# Altium footprint library GamePI PCB LIB.PcbLib: 24 footprints (part 1 of 2)
Each footprint in its own frame and in the unit in brackets; x right, y up, seen from the top. Pads: shape width x height; smd on the part's side, far side on the other; paste and mask are expansions set on the pad; w line width, h text height; cw(c..) or ccw(c..) is an arc to the next point about the centre after c.
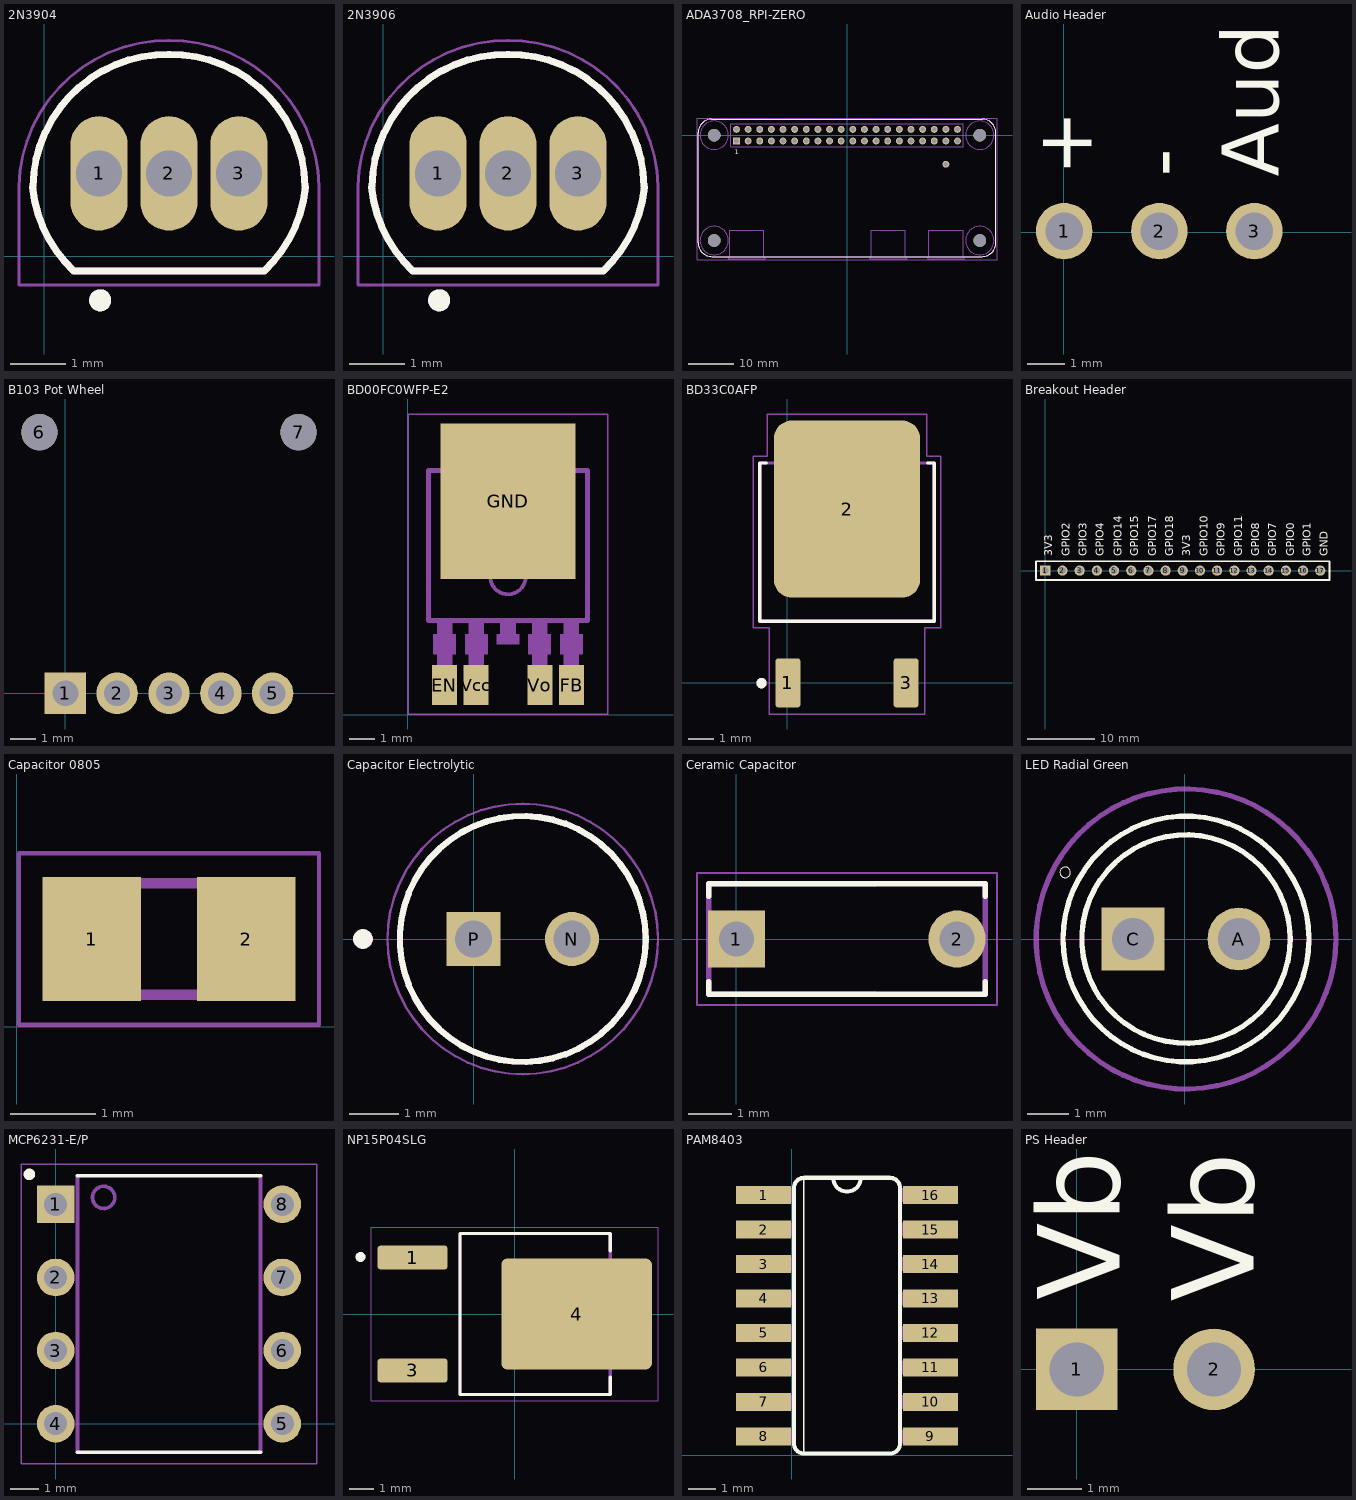
[diagram p0: the footprints below, top view; thin cyan lines are the x and y axes]

## 2N3904 [mm]
pads (3):
  oval 1.04x2.08 hole 0.84: 1(1,1.5) 2(2.27,1.5) 3(3.54,1.5)
Top Overlay:
  circle w0.2: c1.02,-0.805 r0.1
  lines w0.127: -0.206,1.258 ccw(c2.154,1.464) 0.538,-0.269 ; -0.205,1.26 cw(c2.242,1.218) 2.285,3.665 ; 0.545,-0.275 3.995,-0.275 ; 2.255,3.665 cw(c2.298,1.218) 4.745,1.26 ; 4.002,-0.269 ccw(c2.386,1.464) 4.746,1.258
Mechanical 13:
  circle w0.2: c1.02,-0.805 r0.1
  lines w0.127: -0.206,1.258 ccw(c2.154,1.464) 0.538,-0.269 ; -0.205,1.26 cw(c2.242,1.218) 2.285,3.665 ; 0.545,-0.275 3.995,-0.275 ; 2.255,3.665 cw(c2.298,1.218) 4.745,1.26 ; 4.002,-0.269 ccw(c2.386,1.464) 4.746,1.258
Mechanical 15:
  lines w0.05: -0.455,1.245 -0.455,-0.525 4.995,-0.525 4.995,1.245 ; -0.455,1.265 cw(c2.242,1.218) 2.29,3.915 ; 2.25,3.915 cw(c2.298,1.218) 4.995,1.265
3D body "step_temp.STEP": height 5.2, standoff -15.24, extent -0.006,-0.048 4.553,3.785

## 2N3906 [mm]
pads (3):
  oval 1.04x2.08 hole 0.84: 1(1,1.5) 2(2.27,1.5) 3(3.54,1.5)
Top Overlay:
  circle w0.2: c1.02,-0.805 r0.1
  lines w0.127: -0.206,1.258 ccw(c2.154,1.464) 0.538,-0.269 ; -0.205,1.26 cw(c2.242,1.218) 2.285,3.665 ; 0.545,-0.275 3.995,-0.275 ; 2.255,3.665 cw(c2.298,1.218) 4.745,1.26 ; 4.002,-0.269 ccw(c2.386,1.464) 4.746,1.258
Mechanical 13:
  circle w0.2: c1.02,-0.805 r0.1
  lines w0.127: -0.206,1.258 ccw(c2.154,1.464) 0.538,-0.269 ; -0.205,1.26 cw(c2.242,1.218) 2.285,3.665 ; 0.545,-0.275 3.995,-0.275 ; 2.255,3.665 cw(c2.298,1.218) 4.745,1.26 ; 4.002,-0.269 ccw(c2.386,1.464) 4.746,1.258
Mechanical 15:
  lines w0.05: -0.455,1.245 -0.455,-0.525 4.995,-0.525 4.995,1.245 ; -0.455,1.265 cw(c2.242,1.218) 2.29,3.915 ; 2.25,3.915 cw(c2.298,1.218) 4.995,1.265
3D body "step_temp.STEP": height 5.2, standoff -15.24, extent -0.006,-0.048 4.553,3.785

## ADA3708_RPI-ZERO [mm]
pads (45):
  rect 1.508x1.508 hole 1: 1(-24.13,-1.27)
  round 1.508 hole 1: 2(-24.13,1.27) 3(-21.59,-1.27) 4(-21.59,1.27) 5(-19.05,-1.27) 6(-19.05,1.27) 7(-16.51,-1.27) 8(-16.51,1.27) 9(-13.97,-1.27) 10(-13.97,1.27) 11(-11.43,-1.27) 12(-11.43,1.27) 13(-8.89,-1.27) 14(-8.89,1.27) 15(-6.35,-1.27) 16(-6.35,1.27) 17(-3.81,-1.27) 18(-3.81,1.27) 19(-1.27,-1.27) 20(-1.27,1.27) 21(1.27,-1.27) 22(1.27,1.27) 23(3.81,-1.27) 24(3.81,1.27) 25(6.35,-1.27) 26(6.35,1.27) 27(8.89,-1.27) 28(8.89,1.27) 29(11.43,-1.27) 30(11.43,1.27) 31(13.97,-1.27) 32(13.97,1.27) 33(16.51,-1.27) 34(16.51,1.27) 35(19.05,-1.27) 36(19.05,1.27) 37(21.59,-1.27) 38(21.59,1.27) 39(24.13,-1.27) 40(24.13,1.27) 41(21.59,-6.35)
  round 2.75 hole 2.75 unplated: ""(-29,-23) ""(-29,0) ""(29,-23) ""(29,0)
Top Overlay:
  lines w0.127: 4.4,-26.5 12.75,-26.5 ; 17,-26.5 25.35,-26.5 ; -32.5,-23.5 ccw(c-29.5,-23.5) -29.5,-26.5 29.5,-26.5 ccw(c29.5,-23.5) 32.5,-23.5 32.5,0.5 ccw(c29.5,0.5) 29.5,3.5 -29.5,3.5 ccw(c-29.5,0.5) -32.5,0.5 -32.5,-23.5
  text "1" at -24.473,-4.132 h1.02
Mechanical 13:
  circle w0.127: c-29,0 r3.1
  circle w0.127: c29,0 r3.1
  circle w0.127: c29,-23 r3.1
  circle w0.127: c-29,-23 r3.1
  lines w0.127: 4.4,-26.5 5.25,-26.5 ; 17,-26.5 17.85,-26.5 ; -25.65,-26.5 -25.9,-27 -17.9,-27 -18.15,-26.5 ; -25.65,-26.5 -25.65,-20.75 -18.15,-20.75 -18.15,-26.5 ; -25.65,-26.5 -18.15,-26.5 ; -25.65,-26.5 -29.5,-26.5 cw(c-29.5,-23.5) -32.5,-23.5 -32.5,0.5 cw(c-29.5,0.5) -29.5,3.5 29.5,3.5 cw(c29.5,0.5) 32.5,0.5 32.5,-23.5 cw(c29.5,-23.5) 29.5,-26.5 -18.15,-26.5 ; 5.25,-26.5 5,-27 13,-27 12.75,-26.5 ; 5.25,-26.5 5.25,-20.75 12.75,-20.75 12.75,-26.5 ; 5.25,-26.5 12.75,-26.5 ; 17.85,-26.5 17.6,-27 25.6,-27 25.35,-26.5 ; 17.85,-26.5 17.85,-20.75 25.35,-20.75 25.35,-26.5 ; 17.85,-26.5 25.35,-26.5 ; -25.4,-2.54 25.4,-2.54 25.4,2.54 -25.4,2.54 -25.4,-2.54
Mechanical 15:
  lines w0.05: -32.75,-27.25 -32.75,3.75 32.75,3.75 32.75,-27.25 -32.75,-27.25
3D body "ADA3708--3DModel-STEP-56544.STEP": height -0.37, standoff -11.29, extent -32.5,-27.43 33.5,3.57

## Audio Header [mm]
pads (3):
  round 1.508 hole 1: 1(0.01,0.025) 2(2.55,0.025) 3(5.09,0.025)
Top Overlay:
  text "Audio" at 5.746,1.479 h1.52
  text "-" at 3.308,1.479 h1.52
  text "+" at 0.75,1.504 h1.52

## B103 Pot Wheel [mm]
pads (7):
  rect 1.6x1.6 hole 1: 1(0,0)
  round 1.6 hole 1: 2(2,0) 3(4,0) 4(6,0) 5(8,0)
  round 1.4 hole 1.4 unplated: 6(-1,10.075) 7(9,10.075)
3D body "potentiometre disk 5pin.step": height 3.5, standoff -2.38, extent -4,-0.45 12,15.55

## BD00FC0WFP-E2 [mm]
pads (5):
  rect 1x1.6 smd: EN(1.46,1.178) FB(6.54,1.178) Vcc(2.73,1.178) Vo(5.27,1.178)
  rect 5.4x6.2 smd: GND(4,8.508)
Mechanical 13:
  circle w0.152: c4,5.508 r0.707
  region: 4.3,2.808 3.7,2.808 3.7,3.808 4.3,3.808
  region: 1.77,0.958 1.17,0.958 1.17,3.808 1.77,3.808
  region: 3.04,0.958 2.44,0.958 2.44,3.808 3.04,3.808
  region: 5.56,0.958 4.96,0.958 4.96,3.808 5.56,3.808
  region: 6.83,0.958 6.23,0.958 6.23,3.808 6.83,3.808
  region: 1.92,2.408 1.02,2.408 1.02,3.208 1.92,3.208
  region: 3.19,2.408 2.29,2.408 2.29,3.208 3.19,3.208
  region: 5.71,2.408 4.81,2.408 4.81,3.208 5.71,3.208
  region: 6.98,2.408 6.08,2.408 6.08,3.208 6.98,3.208
  region: 4.45,2.808 3.55,2.808 3.55,3.208 4.45,3.208
  region: 6.565,9.895 1.435,9.895 1.435,10.764 1.968,10.764 1.968,10.58 6.032,10.58 6.032,10.764 6.565,10.764
  lines w0.203: 0.823,3.748 0.823,9.743 7.177,9.743 7.177,3.749 0.822,3.749
Mechanical 15:
  lines w0.051: 0.027,0.025 7.973,0.025 7.973,11.991 0.027,11.991 0.027,0.025
3D body "to252-4_p1-27_l6-8_w5-8.stp": height 2.4, standoff -0.01, extent 0.6,0.5 7.4,10.7

## BD33C0AFP [mm]
pads (3):
  rrect24% 0.96x1.9 smd: 1(0.02,-0.01) 3(4.58,-0.01)
  rrect24% 5.63x6.84 smd paste-4: 2(2.3,6.7)
Top Overlay:
  circle w0.2: c-1,-0.02 r0.1
  lines w0.127: -0.822,8.475 -1.07,8.475 -1.07,2.375 5.67,2.375 5.67,8.475 5.422,8.475
Top Paste:
  region: 4.08,4.537 0.517,4.537 0.517,8.863 4.08,8.863
Mechanical 13:
  circle w0.2: c-1,-0.02 r0.1
  lines w0.127: -1.07,2.375 5.67,2.375 5.67,8.475 -1.07,8.475 -1.07,2.375
Mechanical 15:
  lines w0.05: -1.32,2.12 -1.32,8.73 -0.77,8.73 -0.77,10.37 5.37,10.37 5.37,8.73 5.92,8.73 5.92,2.12 5.31,2.12 5.31,-1.21 -0.71,-1.21 -0.71,2.12 -1.32,2.12
3D body "BD33C0AFP-CE2.STEP": height 2.5, standoff 0, extent -0.95,-0.12 5.55,9.38

## Breakout Header [mm]
pads (17):
  rect 1.508x1.508 hole 1: 1(0,0)
  round 1.508 hole 1: 2(2.54,0) 3(5.08,0) 4(7.62,0) 5(10.16,0) 6(12.7,0) 7(15.24,0) 8(17.78,0) 9(20.32,0) 10(22.86,0) 11(25.4,0) 12(27.94,0) 13(30.48,0) 14(33.02,0) 15(35.56,0) 16(38.1,0) 17(40.64,0)
Top Overlay:
  lines w0.254: -1.375,-1.375 42,-1.375 42,1.375 -1.375,1.375 -1.375,-1.375
  text "GND" at 41.771,2.129 h1.2
  text "GPIO1" at 39.271,2.129 h1.2
  text "GPIO0" at 36.771,2.129 h1.2
  text "GPIO7" at 34.146,2.129 h1.2
  text "GPIO8" at 31.646,2.129 h1.2
  text "GPIO11" at 29.146,2.129 h1.2
  text "GPIO9" at 26.521,2.129 h1.2
  text "GPIO10" at 24.021,2.129 h1.2
  text "3V3" at 21.396,2.129 h1.2
  text "GPIO18" at 18.896,2.129 h1.2
  text "GPIO17" at 16.396,2.129 h1.2
  text "GPIO15" at 13.771,2.129 h1.2
  text "GPIO14" at 11.271,2.129 h1.2
  text "GPIO4" at 8.646,2.129 h1.2
  text "GPIO3" at 6.146,2.129 h1.2
  text "GPIO2" at 3.646,2.129 h1.2
  text "3V3" at 1.021,2.129 h1.2

## Capacitor 0805 [mm]
pads (2):
  rect 1.15x1.45 smd: 1(0.875,1.025) 2(2.675,1.025)
Mechanical 13:
  lines w0.127: 0.775,0.375 2.775,0.375 2.775,1.675 0.775,1.675 0.775,0.375
Mechanical 15:
  lines w0.05: 0.025,0.025 3.525,0.025 3.525,2.025 0.025,2.025 0.025,0.025
3D body "step_temp.STEP": height 0.94, standoff 0, extent 0.77,0.4 2.78,1.65

## Capacitor Electrolytic [mm]
pads (2):
  round 1.1 hole 0.75: N(2,0)
  rect 1.1x1.1 hole 0.75: P(0,0)
Top Overlay:
  circle w0.127: c1,0 r2.5
  circle w0.2: c-2.25,0 r0.1
Mechanical 13:
  circle w0.127: c1,0 r2.5
  circle w0.2: c-2.25,0 r0.1
Mechanical 15:
  circle w0.05: c1,0 r2.75
3D body "step_temp.STEP": height 11, standoff -17, extent -1.5,-2.498 3.5,2.498

## Ceramic Capacitor [mm]
pads (2):
  rect 1.318x1.318 / inner round 1.318 / far side rect 1.318x1.318 hole 0.81: 1(0,0)
  round 1.318 hole 0.81: 2(5.08,0)
Top Overlay:
  lines w0.127: -0.635,-0.979 -0.635,-1.27 5.725,-1.27 5.725,-0.979 ; -0.635,0.979 -0.635,1.27 5.725,1.27 5.725,0.979
Mechanical 13:
  lines w0.127: 3.175,-1.27 -0.635,-1.27 -0.635,1.27 3.175,1.27 ; 5.725,-1.27 5.725,-0.635 5.725,0.635 5.725,1.27
Mechanical 15:
  lines w0.05: -0.909,-1.52 -0.909,1.52 6,1.52 6,-1.52 -0.909,-1.52

## LED Radial Green [mm]
pads (2):
  round 1.508 hole 1: A(1.3,0)
  rect 1.508x1.508 hole 1: C(-1.24,0)
Top Overlay:
  circle w0.127: c0.03,0 r2.95
  circle w0.127: c0.03,0 r2.5
  circle w0: c-2.87,1.6 r0.127
Mechanical 15:
  circle w0.127: c0.03,0 r3.6
3D body "WP7113GD.STEP": height 9.6, standoff -26, extent -2.5,-2.95 2.934,2.95

## MCP6231-E/P [mm]
pads (8):
  rect 1.308x1.308 hole 0.8: 1(0,7.62)
  round 1.308 hole 0.8: 2(0,5.08) 3(0,2.54) 4(0,0) 5(7.87,0) 6(7.87,2.54) 7(7.87,5.08) 8(7.87,7.62)
Top Overlay:
  circle w0.2: c-0.915,8.66 r0.1
  lines w0.127: 0.755,-0.99 7.115,-0.99 ; 0.755,8.61 7.115,8.61
Mechanical 13:
  circle w0.127: c1.665,7.86 r0.386
  lines w0.127: 0.755,-0.99 0.755,8.61 ; 7.115,-0.99 7.115,8.61
Mechanical 15:
  lines w0.05: -1.195,-1.4 -1.195,9.02 9.065,9.02 9.065,-1.4 -1.195,-1.4
3D body "MCP6231-E_P.STEP": height 5.52, standoff -3.62, extent -0.037,-0.835 7.837,8.436

## NP15P04SLG [mm]
pads (3):
  rrect25% 2.83x0.97 smd mask+0: 1(-4.14,2.29) 3(-4.14,-2.29)
  rrect10% 6.1x4.49 smd paste-4 mask+0: 4(2.51,0)
Top Overlay:
  circle w0.2: c-6.25,2.312 r0.1
  lines w0.127: 3.872,-2.565 3.872,-3.27 -2.222,-3.27 -2.222,3.27 3.872,3.27 3.872,2.565
Mechanical 13:
  circle w0.2: c-6.25,2.312 r0.1
  lines w0.127: -2.222,-3.27 -2.222,3.27 3.872,3.27 3.872,-3.27 -2.222,-3.27
Mechanical 15:
  lines w0.05: -5.805,-3.52 -5.805,3.52 5.81,3.52 5.81,-3.52 -5.805,-3.52
3D body "step_temp.STEP": height 2.39, standoff -0.13, extent -4.952,-3.27 4.952,3.27

## PAM8403 [mil]
pads (16):
  rect 80x26 smd: 1(-41.12,377.56) 2(-41.12,327.56) 3(-41.12,277.56) 4(-41.12,227.56) 5(-41.12,177.56) 6(-41.12,127.56) 7(-41.12,77.56) 8(-41.12,27.56) 9(200.88,27.56) 10(200.88,77.56) 11(200.88,127.56) 12(200.88,177.56) 13(200.88,227.56) 14(200.88,277.56) 15(200.88,327.56) 16(200.88,377.56)
Top Overlay:
  lines w2: 16.88,2.56 16.88,402.56
  lines w6: 59.88,402.56 ccw(c79.88,402.56) 99.88,402.56 ; 2.88,17.56 ccw(c17.88,17.56) 17.88,2.56 141.88,2.56 ccw(c141.88,17.56) 156.88,17.56 156.88,387.56 ccw(c141.88,387.56) 141.88,402.56 17.88,402.56 ccw(c17.88,387.56) 2.88,387.56 2.88,17.56
Mechanical 13:
  region: 201.88,217.56 156.88,217.56 156.88,237.56 201.88,237.56
  region: 2.88,367.56 -42.12,367.56 -42.12,387.56 2.88,387.56
  region: 2.88,317.56 -42.12,317.56 -42.12,337.56 2.88,337.56
  region: 3.88,267.56 -41.12,267.56 -41.12,287.56 3.88,287.56
  region: 2.88,217.56 -42.12,217.56 -42.12,237.56 2.88,237.56
  region: 201.88,267.56 156.88,267.56 156.88,287.56 201.88,287.56
  region: 201.88,317.56 156.88,317.56 156.88,337.56 201.88,337.56
  region: 201.88,367.56 156.88,367.56 156.88,387.56 201.88,387.56
  region: 2.88,167.56 -42.12,167.56 -42.12,187.56 2.88,187.56
  region: 2.88,117.56 -42.12,117.56 -42.12,137.56 2.88,137.56
  region: 2.88,67.56 -42.12,67.56 -42.12,87.56 2.88,87.56
  region: 2.88,17.56 -42.12,17.56 -42.12,37.56 2.88,37.56
  region: 201.88,167.56 156.88,167.56 156.88,187.56 201.88,187.56
  region: 201.88,117.56 156.88,117.56 156.88,137.56 201.88,137.56
  region: 201.88,67.56 156.88,67.56 156.88,87.56 201.88,87.56
  region: 201.88,17.56 156.88,17.56 156.88,37.56 201.88,37.56
3D body "pam8403dr.stp": height 63.98, standoff 0, extent -38.39,6.89 199.8,396.65

## PS Header [mm]
pads (2):
  rect 1.508x1.508 hole 1 mask+0: 1(0,0)
  round 1.508 hole 1 mask+0: 2(2.54,0)
Top Overlay:
  text "Vbat-" at 3.271,1.254 h1.52
  text "Vbat+" at 0.796,1.279 h1.52